# Altium integrated library Ind LED-LCD.IntLib: 63 symbols
Pins are listed as number, name and electrical type; pins without a type are passive.

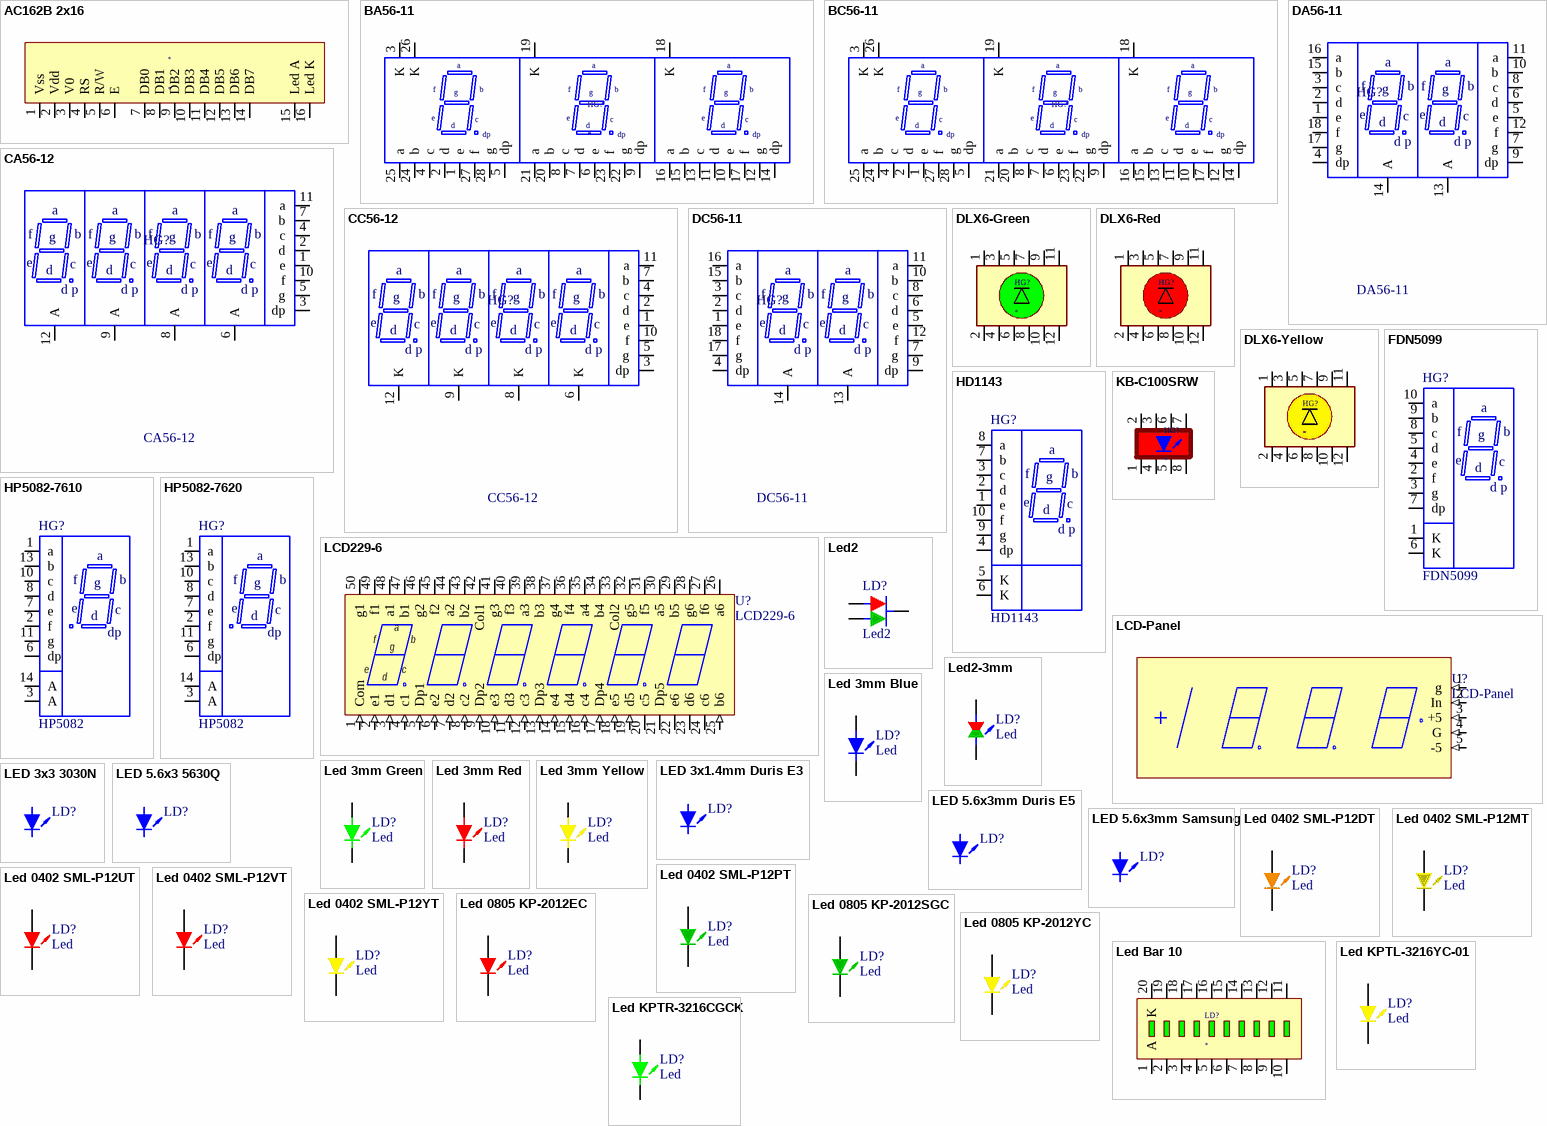
[diagram p0: symbols AC162B 2x16 to Led KPTR-3216CGCK]

## AC162B 2x16
designator *
footprint AC-162B 2x16
pins: 1 Vss, 2 Vdd, 3 V0, 4 RS, 5 R/W, 6 E, 7 DB0, 8 DB1, 9 DB2, 10 DB3, 11 DB4, 12 DB5, 13 DB6, 14 DB7, 15 Led A, 16 Led K

## BA56-11
designator HG?
footprint Bx56-11
pins: 1 e, 2 d, 3 K, 4 c, 5 dp, 6 e, 7 d, 8 c, 9 dp, 10 e, 11 d, 12 g, 13 c, 14 dp, 15 b, 16 a, 17 f, 18 K, 19 K, 20 b, 21 a, 22 g, 23 f, 24 b, 25 a, 26 K, 27 f, 28 g

## BC56-11
designator HG?
footprint Bx56-11
pins: 1 e, 2 d, 3 K, 4 c, 5 dp, 6 e, 7 d, 8 c, 9 dp, 10 e, 11 d, 12 g, 13 c, 14 dp, 15 b, 16 a, 17 f, 18 K, 19 K, 20 b, 21 a, 22 g, 23 f, 24 b, 25 a, 26 K, 27 f, 28 g

## CA56-12
designator HG?
Price: 0.948
footprint Cx56-12 (Footprint not found)
pins: 1 e, 2 d, 3 dp, 4 c, 5 g, 6 A, 7 b, 8 A, 9 A, 10 f, 11 a, 12 A
2 alternate drawings of the same symbol
text: d p

## CC56-12
designator HG?
Price: 0.948
footprint Cx56-12 (Footprint not found)
pins: 1 e, 2 d, 3 dp, 4 c, 5 g, 6 K, 7 b, 8 K, 9 K, 10 f, 11 a, 12 K
2 alternate drawings of the same symbol
text: d p

## DA56-11
designator HG?
Price: 0.948
footprint Dx56-11 (Footprint not found)
pins: 1 e, 2 d, 3 c, 4 dp, 5 e, 6 d, 7 g, 8 c, 9 dp, 10 b, 11 a, 12 f, 13 A, 14 A, 15 b, 16 a, 17 g, 18 f
2 alternate drawings of the same symbol
text: d p

## DC56-11
designator HG?
Price: 0.948
footprint Dx56-11 (Footprint not found)
pins: 1 e, 2 d, 3 c, 4 dp, 5 e, 6 d, 7 g, 8 c, 9 dp, 10 b, 11 a, 12 f, 13 A, 14 A, 15 b, 16 a, 17 g, 18 f
2 alternate drawings of the same symbol
text: d p

## DLX6-Green
designator HG?
footprint DLX6-Green (Footprint not found)
pins: 1 K, 2 A, 3 K, 4 K, 5 K, 6 K, 7 K, 8 K, 9 K, 10 K, 11 K, 12 K

## DLX6-Red
designator HG?
footprint DLX6-red
pins: 1 K, 2 A, 3 K, 4 K, 5 K, 6 K, 7 K, 8 K, 9 K, 10 K, 11 K, 12 K

## DLX6-Yellow
designator HG?
footprint DLX6-Yellow
pins: 1 K, 2 A, 3 K, 4 K, 5 K, 6 K, 7 K, 8 K, 9 K, 10 K, 11 K, 12 K

## FDN5099
designator HG?
footprint SA36-11 Red
pins: 1 K, 2 f, 3 g, 4 e, 5 d, 6 K, 7 dp, 8 c, 9 b, 10 a
2 alternate drawings of the same symbol
text: d p

## HD1143
designator HG?
footprint SA52-11 Red
pins: 1 e, 2 d, 3 c, 4 dp, 5 K, 6 K (power), 7 b, 8 a, 9 g, 10 f
2 alternate drawings of the same symbol
text: d p

## HP5082-7610
designator HG?, comment HP5082
0.3" OA Red; Price: 1.10
footprint HP5082-7610 Red
pins: 1 a, 2 f, 3 A, 6 dp, 7 e, 8 d, 10 c, 11 g, 13 b, 14 A
2 alternate drawings of the same symbol

## HP5082-7620
designator HG?, comment HP5082
0.3" OA Yellow; Price: 1.10
footprint HP5082-7620 Yllow
pins: 1 a, 2 f, 3 A, 6 dp, 7 e, 8 d, 10 c, 11 g, 13 b, 14 A
2 alternate drawings of the same symbol

## KB-C100SRW
designator HG?
footprint LED8-300 red
pins: 1 K, 2 A, 3 K, 4 K, 5 K, 6 K, 7 K, 8 K

## LCD229-6
designator U?
OD-601
footprint LCD229 (OD-601) (Footprint not found)
pins: 1 Com (in), 2 e1 (in), 3 d1 (in), 4 c1 (in), 5 Dp1 (in), 6 e2 (in), 7 d2 (in), 8 c2 (in), 9 Dp2 (in), 10 e3 (in), 11 d3 (in), 12 c3 (in), 13 Dp3 (in), 14 e4 (in), 15 d4 (in), 16 c4 (in), 17 Dp4 (in), 18 e5 (in), 19 d5 (in), 20 c5, 21 Dp5, 22 e6, 23 d6, 24 c6, 25 b6 (in), 26 a6, 27 f6, 28 g6, 29 b5, 30 a5, 31 f5, 32 g5, 33 Col2, 34 b4, 35 a4, 36 f4, 37 g4, 38 b3, 39 a3, 40 f3, 41 g3, 42 Col1, 43 b2, 44 a2, 45 f2, 46 g2, 47 b1, 48 a1, 49 f1, 50 g1
text: a; f; b; g; e; c; d

## LCD-Panel
designator U?
footprint LCD-Panel
pins: 1 g (in), 2 In (in), 3 +5 (in), 4 G (in), 5 -5 (in)

## Led2
designator LD?
footprint Led 3
footprint lED 3A
pins: 1 A1, 2 K, 3 A2
1 alternate drawing of the same symbol

## Led2-3mm
designator LD?, comment Led
3mm Dual; Price: 0.05
footprint Led d3mm Green
pins: 1 A, 2 K
1 alternate drawing of the same symbol

## Led 3mm Blue
designator LD?, comment Led
3mm; Price: 0.05
footprint Led d3mm Blue
simulation model BLUE (Model Description)
pins: 1 A, 2 K
1 alternate drawing of the same symbol

## Led 3mm Green
designator LD?, comment Led
3mm; Price: 0.05
footprint Led d3mm Green
simulation model Green (Model Description)
pins: 1 A, 2 K
1 alternate drawing of the same symbol

## Led 3mm Red
designator LD?, comment Led
3mm; Price: 0.05
footprint Led d3mm Red
simulation model Red (Model Description)
pins: 1 A, 2 K
1 alternate drawing of the same symbol

## Led 3mm Yellow
designator LD?, comment Led
3mm; Price: 0.05
footprint Led d3mm Yellow
pins: 1 A, 2 K
1 alternate drawing of the same symbol

## LED 3x1.4mm Duris E3
designator LD?
30mA 1.94-2.8cd (20ma)
footprint LED 3.1x1.4mm Duris E3
pins: 1 A, 2 K
1 alternate drawing of the same symbol

## LED 3x3 3030N
designator LD?
200mA 791-127lm (150ma) 6V
footprint LED 3030N
pins: 1 A, 2 K
1 alternate drawing of the same symbol

## LED 5.6x3 5630Q
designator LD?
150mA 7.3-9.9cd (65ma) 3V
footprint LED 5630Q
pins: 1 A, 2 K
1 alternate drawing of the same symbol

## LED 5.6x3mm Duris E5
designator LD?
150mA 12-15cd (120ma)
footprint LED 5.6x3mm Duris E5 (LED Samsung SMD)
pins: 0 A hidden, 1 A, 2 K
1 alternate drawing of the same symbol

## LED 5.6x3mm Samsung
designator LD?
150mA 5.3-8.12cd (50ma); Price: 0.05
footprint LED 5.6x3mm Samsung (LED Samsung SMD)
pins: 0 K hidden, 1 A, 2 K
1 alternate drawing of the same symbol

## Led 0402 SML-P12DT
designator LD?, comment Led
Orange 605nm 100mcd; Price: 0.15
footprint Led 0402-Oranje ((1005) Metric)
simulation model SML-P12DT (Model Description)
pins: 1 A, 2 K
1 alternate drawing of the same symbol

## Led 0402 SML-P12MT
designator LD?, comment Led
Yellowсish Green 572nm 35mcd; Price: 0.15
footprint Led 0402-Yellow ((1005) Metric)
simulation model SML-P12MT (Model Description)
pins: 1 A, 2 K
1 alternate drawing of the same symbol

## Led 0402 SML-P12PT
designator LD?, comment Led
Green 560nm 13mcd; Price: 0.15
footprint Led 0402-Green ((1005) Metric)
simulation model SML-P12PT (Model Description)
pins: 1 A, 2 K
1 alternate drawing of the same symbol

## Led 0402 SML-P12UT
designator LD?, comment Led
Red 630nm 85mcd; Price: 0.15
footprint Led 0402-Red ((1005) Metric)
simulation model SML-P12UT (Model Description)
pins: 1 A, 2 K
1 alternate drawing of the same symbol

## Led 0402 SML-P12VT
designator LD?, comment Led
Red 630nm 60mcd; Price: 0.15
footprint Led 0402-Red ((1005) Metric)
simulation model SML-P12VT (Model Description)
pins: 1 A, 2 K
1 alternate drawing of the same symbol

## Led 0402 SML-P12YT
designator LD?, comment Led
Yellow 590nm 130mcd; Price: 0.15
footprint Ld0805-Yellow
simulation model SML-P12YT (Model Description)
pins: 1 A, 2 K
1 alternate drawing of the same symbol

## Led 0805 KP-2012EC
designator LD?, comment Led
Red  627nm 12mcd; Price: 0.09
footprint Led 0805-Red (Footprint not found)
pins: 1 A, 2 K
1 alternate drawing of the same symbol

## Led 0805 KP-2012SGC
designator LD?, comment Led
Green 565nm 15mcd; Price: 0.09
footprint Led 0805-Green (Footprint not found)
pins: 1 A, 2 K
1 alternate drawing of the same symbol

## Led 0805 KP-2012YC
designator LD?, comment Led
Yellow 590nm 8mcd; Price: 0.09
footprint Led 0805-Yellow (Footprint not found)
pins: 1 A, 2 K
1 alternate drawing of the same symbol

## Led Bar 10
designator LD?
Price: 1.5
footprint Led Bar 10 (Footprint not found)
pins: 1 A, 2 K, 3 K, 4 K, 5 K, 6 K, 7 K, 8 K, 9 K, 10 K, 11, 12 A, 13 A, 14 A, 15 A, 16 A, 17 A, 18 A, 19 A, 20 K

## Led KPTL-3216YC-01
designator LD?, comment Led
Yellow 590nm 35mcd ф 1.6mm; Price: 0.15
footprint Led 3.2x1.6mm SMD Ф1.6mm
simulation model SML-P12MT (Model Description)
pins: 1 A, 2 K
1 alternate drawing of the same symbol

## Led KPTR-3216CGCK
designator LD?, comment Led
Green 3.2x1.6mm 1.4мм Квадрат обърнат; Price: 0.15
footprint Led 3.2x1.6mm SMD Square 1.4mm
simulation model SML-P12MT (Model Description)
pins: 1 A, 2 K
1 alternate drawing of the same symbol

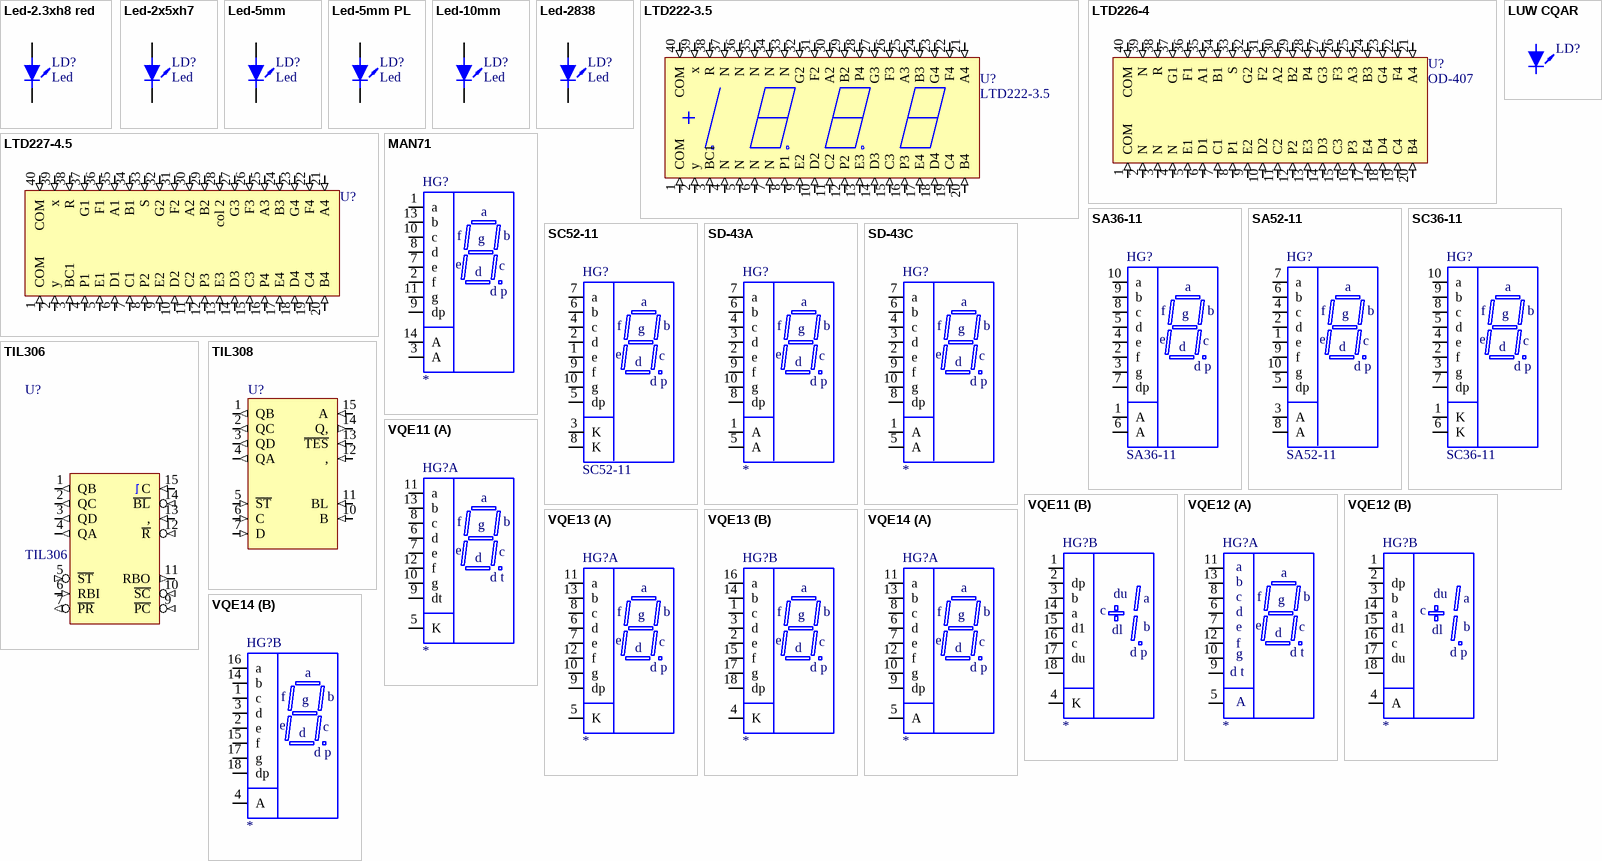
[diagram p1: symbols Led-2.3xh8 red to VQE14]

## Led-2.3xh8 red
designator LD?, comment Led
Price: 0.15
footprint Led 2.3xh8 red
pins: 1 A, 2 K
1 alternate drawing of the same symbol

## Led-2x5xh7
designator LD?, comment Led
Price: 0.15
footprint Led 2x5xh7 Red
footprint Led 2x5xh7 Green
footprint Led 2x5xh7 Yellou
pins: 1 A, 2 K
1 alternate drawing of the same symbol

## Led-5mm
designator LD?, comment Led
5mm; Price: 0.05
footprint Led d5mm
footprint LD2
pins: 1 A, 2 K
1 alternate drawing of the same symbol

## Led-5mm PL
designator LD?, comment Led
5mm; Price: 0.05
footprint Led d5mm - Pl
pins: 1 A, 2 K
1 alternate drawing of the same symbol

## Led-10mm
designator LD?, comment Led
10mm
footprint Led d10mm
footprint LD2
pins: 1 A, 2 K
1 alternate drawing of the same symbol

## Led-2838
designator LD?, comment Led
2.8x3.5mm 90mA 2.6-3V (30mA) 13-15Lm; Price: 0.15
footprint Led 2835 (2.8x3.5mm)
pins: 1 A, 2 K
1 alternate drawing of the same symbol

## LTD222-3.5
designator U?
OD-401
footprint LCD-3.5
pins: 1 COM (in), 2 y (in), 3 BC1 (in), 4 N (in), 5 N (in), 6 N (in), 7 N (in), 8 P1 (in), 9 E2 (in), 10 D2 (in), 11 C2 (in), 12 P2 (in), 13 E3 (in), 14 D3 (in), 15 C3 (in), 16 P3 (in), 17 E4 (in), 18 D4 (in), 19 C4 (in), 20 B4 (in), 21 A4 (in), 22 F4 (in), 23 G4 (in), 24 B3 (in), 25 A3 (in), 26 F3 (in), 27 G3 (in), 28 P4 (in), 29 B2 (in), 30 A2 (in), 31 F2 (in), 32 G2 (in), 33 N (in), 34 N (in), 35 N (in), 36 N (in), 37 N (in), 38 R (in), 39 x (in), 40 COM (in)

## LTD226-4
designator U?, comment OD-407
Value: OD-407; Price: 3.5
footprint LCD-3.5
pins: 1 COM (in), 2 N (in), 3 N (in), 4 N (in), 5 E1 (in), 6 D1 (in), 7 C1 (in), 8 P1 (in), 9 E2 (in), 10 D2 (in), 11 C2 (in), 12 P2 (in), 13 E3 (in), 14 D3 (in), 15 C3 (in), 16 P3 (in), 17 E4 (in), 18 D4 (in), 19 C4 (in), 20 B4 (in), 21 A4 (in), 22 F4 (in), 23 G4 (in), 24 B3 (in), 25 A3 (in), 26 F3 (in), 27 G3 (in), 28 P4 (in), 29 B2 (in), 30 A2 (in), 31 F2 (in), 32 G2 (in), 33 S (in), 34 B1 (in), 35 A1 (in), 36 F1 (in), 37 G1 (in), 38 R (in), 39 N (in), 40 COM (in)

## LTD227-4.5
designator U?
footprint LCD-3.5
pins: 1 COM (in), 2 y (in), 3 BC1 (in), 4 P1 (in), 5 E1 (in), 6 D1 (in), 7 C1 (in), 8 P2 (in), 9 E2 (in), 10 D2 (in), 11 C2 (in), 12 P3 (in), 13 E3 (in), 14 D3 (in), 15 C3 (in), 16 P4 (in), 17 E4 (in), 18 D4 (in), 19 C4 (in), 20 B4 (in), 21 A4 (in), 22 F4 (in), 23 G4 (in), 24 B3 (in), 25 A3 (in), 26 F3 (in), 27 G3 (in), 28 col 2 (in), 29 B2 (in), 30 A2 (in), 31 F2 (in), 32 G2 (in), 33 S (in), 34 B1 (in), 35 A1 (in), 36 F1 (in), 37 G1 (in), 38 R (in), 39 x (in), 40 COM (in)

## LUW CQAR
designator LD?
3x3mm 0.7A 300lm
footprint Led LUW CQAR
pins: 0 T hidden, 1 A, 2 K
1 alternate drawing of the same symbol

## MAN71
designator HG?
Price: 1.10
footprint MAN71
pins: 1 a, 2 f, 3 A, 7 e, 8 d, 9 dp, 10 c, 11 g, 13 b, 14 A
2 alternate drawings of the same symbol
text: d p

## SA36-11
designator HG?
Price: 1.25
footprint SA36-11 Green
footprint SA36-11 Red
footprint SA36-11 Yellow
pins: 1 A, 2 f, 3 g, 4 e, 5 d, 6 A, 7 dp, 8 c, 9 b, 10 a
2 alternate drawings of the same symbol
text: d p

## SA52-11
designator HG?
Price: 1.25
footprint SA52-11 Green
footprint SA52-11 Red
footprint SA52-11 Yellow
pins: 1 e, 2 d, 3 A, 4 c, 5 dp, 6 b, 7 a, 8 A, 9 f, 10 g
2 alternate drawings of the same symbol
text: d p

## SC36-11
designator HG?
Price: 1.25
footprint SA36-11 Green
footprint SA36-11 Red
footprint SA36-11 Yellow
pins: 1 K, 2 f, 3 g, 4 e, 5 d, 6 K, 7 dp, 8 c, 9 b, 10 a
2 alternate drawings of the same symbol
text: d p

## SC52-11
designator HG?
Price: 1.25
footprint SA52-11 Green
footprint SA52-11 Red
footprint SA52-11 Yellow
pins: 1 e, 2 d, 3 K, 4 c, 5 dp, 6 b, 7 a, 8 K, 9 f, 10 g
2 alternate drawings of the same symbol
text: d p

## SD-43A
designator HG?
pins: 1 A, 2 e, 3 d, 4 c, 5 A, 6 b, 7 a, 8 dp, 9 f, 10 g
2 alternate drawings of the same symbol
text: d p

## SD-43C
designator HG?
pins: 1 A, 2 e, 3 d, 4 c, 5 A, 6 b, 7 a, 8 dp, 9 f, 10 g
2 alternate drawings of the same symbol
text: d p

## TIL306
designator U?
Price: 5
footprint TIL30x h5.08
pins: 1 QB (out), 2 QC (out), 3 QD (out), 4 QA (out), 5 ~{ST} (in), 6 RBI (in), 7 ~{PR} (out), 8 GND (power) hidden to GND, 9 ~{PC} (in), 10 ~{SC} (in), 11 RBO (out), 12 ~{R} (in), 13 , (in), 14 ~{BL} (in), 15 C (in), 16 VCC (power) hidden to VCC

## TIL308
designator U?
footprint TIL30x h5.08
pins: 1 QB (out), 2 QC (out), 3 QD (out), 4 QA (out), 5 ~{ST} (in), 6 C (in), 7 D (in), 8 GND (power) hidden to GND, 10 B (in), 11 BL (in), 12 , (in), 13 ~{TES} (in), 14 Q, (out), 15 A (in), 16 VCC (power) hidden to VCC

## VQE11
designator HG?
footprint Dx56-11
part A pins: 5 K, 6 d, 7 e, 8 c, 9 dt, 10 g, 11 a, 12 f, 13 b
part B pins: 1, 2 dp, 3 b, 4 K, 14 a, 15 d1, 16 c, 17 du, 18
2 alternate drawings of the same symbol
part A text: d t
part B text: dl; d p

## VQE12
designator HG?
footprint Dx56-11
part A pins: 5 A, 6 D, 7 E, 8 C, 9 DT, 10 G, 11 A, 12 F, 13 B
part B pins: 1, 2 dp, 3 b, 4 A, 14 a, 15 d1, 16 c, 17 du, 18
2 alternate drawings of the same symbol
part A text: f; g; d; e; d t
part B text: dl; d p

## VQE13
designator HG?
footprint Dx56-11
part A pins: 5 K, 6 d, 7 e, 8 c, 9 dp, 10 g, 11 a, 12 f, 13 b
part B pins: 1 c, 2 e, 3 d, 4 K, 14 b, 15 f, 16 a, 17 g, 18 dp
2 alternate drawings of the same symbol
part A text: d p
part B text: d p

## VQE14
designator HG?
footprint Dx56-11
part A pins: 5 A, 6 d, 7 e, 8 c, 9 dp, 10 g, 11 a, 12 f, 13 b
part B pins: 1 c, 2 e, 3 d, 4 A, 14 b, 15 f, 16 a, 17 g, 18 dp
2 alternate drawings of the same symbol
part A text: d p
part B text: d p